# Altium integrated library TE PCB Connectors.IntLib: 30 symbols
Pins are listed as number, name and electrical type; pins without a type are passive.

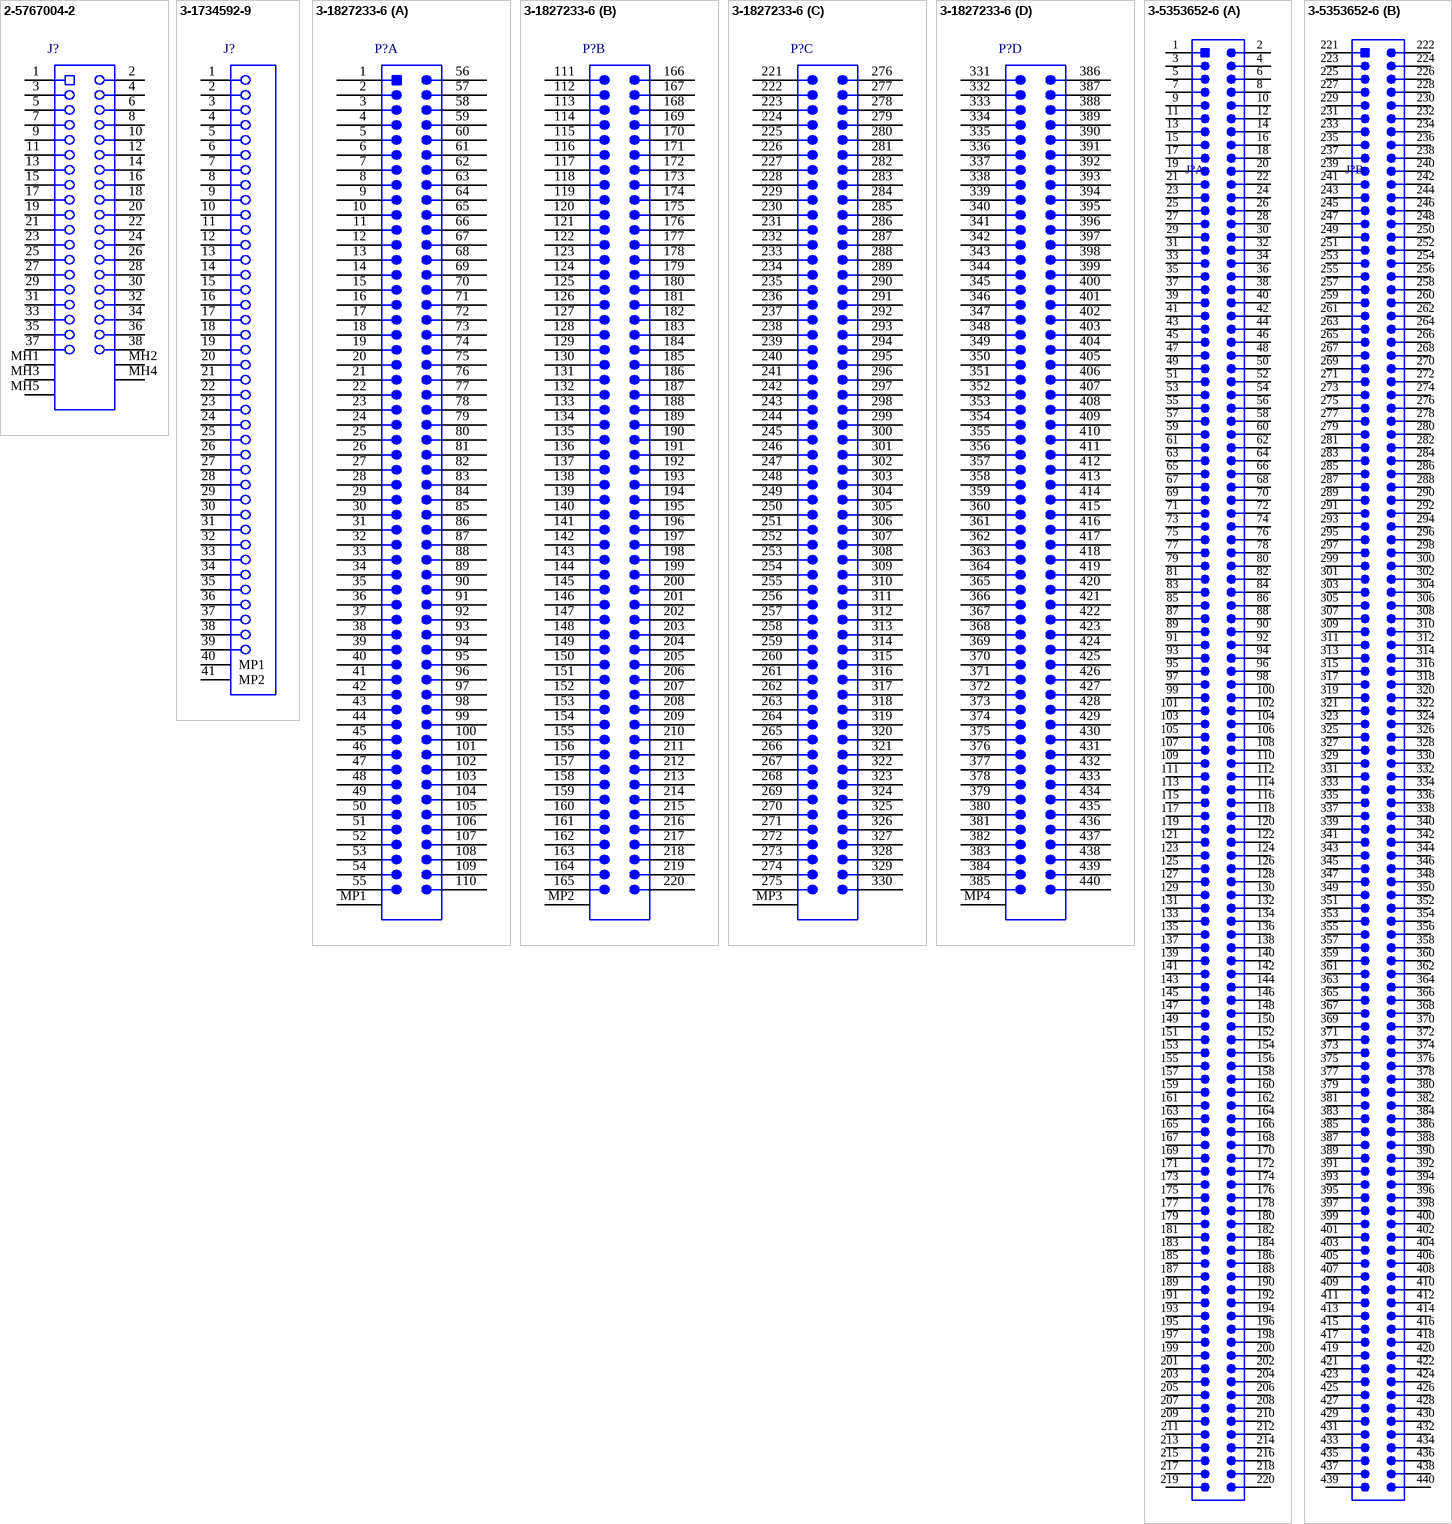
[diagram p0: symbols 2-5767004-2 to 3-5353652-6]

## 2-5767004-2
designator J?
Female Header, Pitch 0.64 mm, 2 x 19 Position, Height 6.35 mm, Tail Height 1.35 mm, RoHS, Tube; Pitch Spacing: 0.64mm; Row Pitch: 7.06mm; Gender: Receptacle; No. of Rows: 2; Product Range: MICTOR Series; No. of Contacts: 38; Contact Termination Type: Surface Mount; SVHC: To Be Advised; DatasheetVersion: Rev. D3; PackageReference: SMD; PackageDescription: Female Receptacle, Pitch 0.64 mm, 2 x 19 Position, Height 6.35 mm, Tail Height 1.35 mm; Supplier 1: Digi-Key; Supplier Part Number 1: A32308-ND; Contact Plating: Gold; Contact Material: Copper Alloy; Mounting Technology: Surface Mount; ComponentLink1Description: Manufacturer URL; ComponentLink1URL: http://www.te.com; ComponentLink2Description: Datasheet; ComponentLink2URL: http://www.te.com/commerce/DocumentDelivery/DDEController?Action=showdoc&DocId=Customer+Drawing%7F5767004%7FD3%7Fpdf%7FEnglish%7FENG_CD_5767004_D3.pdf%7F2-5767004-2
footprint TECO-2-5767004-2_V (Receptacle, 38-Leads, Body 25.4x6.91mm, Pitch 0.64mm)
pins: 1, 2, 3, 4, 5, 6, 7, 8, 9, 10, 11, 12, 13, 14, 15, 16, 17, 18, 19, 20, 21, 22, 23, 24, 25, 26, 27, 28, 29, 30, 31, 32, 33, 34, 35, 36, 37, 38, MH1, MH2, MH3, MH4, MH5

## 3-1734592-9
designator J?
FPC Connector, 0.5 A Max Current Rating, 250 V Operating Voltage, -20 to 85 degC, Pitch 0.5 mm, 1 x 39 Positions, RoHS, Tape and Reel; FFC, FCB Thickness: 0.30mm; Dynamic Catalog: 1734592, 1734742 and 1734839; Other Names: A101320DKR; Connector Type: Bottom Contacts; Current Rating: 0.500A; Number of Positions: 39; Pitch: 0.020" (0.50mm); Cable End Type: Straight; Locking Feature: Flip Lock; Voltage Rating: 250V; DatasheetVersion: Rev. C; PackageReference: SMD; Supplier 1: Digi-Key; Supplier Part Number 1: A101320TR-ND; Supplier 2: Digi-Key; Supplier Part Number 2: A101320CT-ND; Supplier 3: Digi-Key; Supplier Part Number 3: A101320DKR-ND; Operating Temperature: -40°C ~ 125°C; Features: Zero Insertion Force (ZIF); Contact Finish Thickness: Flash; Packaging: Digi-Reel®; Termination: Solder; Family: FFC, FPC (Flat Flexible) Connectors - Board Mount; Contact Finish: Gold; Housing Material: Liquid Crystal Polymer (LCP); RoHS Information: 3-1734592-9 Statement of Compliance; Mounting Type: Surface Mount, Right Angle; Height Above Board: 0.081" (2.05mm); Standard Package: 1; Category: Connectors, Interconnects; ComponentLink1Description: Manufacturer URL; ComponentLink1URL: http://www.te.com; ComponentLink2Description: Datasheet; ComponentLink2URL: http://www.te.com/catalog/pn/en/3-1734592-9?RQPN=3-1734592-9
footprint TECO-3-1734592-9-39_V (SMD, 39-Leads, Body 24.93x4.4mm, Pitch  0.5mm)
pins: 1, 2, 3, 4, 5, 6, 7, 8, 9, 10, 11, 12, 13, 14, 15, 16, 17, 18, 19, 20, 21, 22, 23, 24, 25, 26, 27, 28, 29, 30, 31, 32, 33, 34, 35, 36, 37, 38, 39, 40 MP1 "SCK for SPI serial clock SCL for I2C serial clock", 41 MP2 "SCK for SPI serial clock SCL for I2C serial clock"

## 3-1827233-6
designator P?
Connector Plug, Pitch 0.5 mm, 4 x 110 Position, Height 5.75 mm, -40 to 85 degC, RoHS, Tray; Pitch Spacing: 0.5mm; Row Pitch: 12mm; No. of Rows: 2; Product Range: FSI Series; No. of Contacts: 440; Contact Termination Type: Surface Mount; SVHC: To Be Advised; DatasheetVersion: Rev. B2; PackageReference: SMD; PackageDescription: Connector Plug, Pitch 0.5 mm, 4 x 110 Position, Height 5.75 mm; Supplier 1: Digi-Key; Supplier Part Number 1: 3-1827233-6-ND; Gender: Plug; Contact Plating: Gold; Contact Material: Copper Alloy; Mounting Technology: Surface Mount; ComponentLink1Description: Manufacturer URL; ComponentLink1URL: http://www.te.com; ComponentLink2Description: Datasheet; ComponentLink2URL: http://www.te.com/commerce/DocumentDelivery/DDEController?Action=showdoc&DocId=Customer+Drawing%7F1827233%7FB2%7Fpdf%7FEnglish%7FENG_CD_1827233_B2.pdf%7F3-1827233-6
footprint TECO-3-1827233-6_V (SMD, 440-Leads, Body 61.9x18.4mm, Pitch 0.5mm)
part A pins: 1, 2, 3, 4, 5, 6, 7, 8, 9, 10, 11, 12, 13, 14, 15, 16, 17, 18, 19, 20, 21, 22, 23, 24, 25, 26, 27, 28, 29, 30, 31, 32, 33, 34, 35, 36, 37, 38, 39, 40, 41, 42, 43, 44, 45, 46, 47, 48, 49, 50, 51, 52, 53, 54, 55, 56, 57, 58, 59, 60, 61, 62, 63, 64, 65, 66, 67, 68, 69, 70, 71, 72, 73, 74, 75, 76, 77, 78, 79, 80, 81, 82, 83, 84, 85, 86, 87, 88, 89, 90, 91, 92, 93, 94, 95, 96, 97, 98, 99, 100, 101, 102, 103, 104, 105, 106, 107, 108, 109, 110, MP1
part B pins: 111, 112, 113, 114, 115, 116, 117, 118, 119, 120, 121, 122, 123, 124, 125, 126, 127, 128, 129, 130, 131, 132, 133, 134, 135, 136, 137, 138, 139, 140, 141, 142, 143, 144, 145, 146, 147, 148, 149, 150, 151, 152, 153, 154, 155, 156, 157, 158, 159, 160, 161, 162, 163, 164, 165, 166, 167, 168, 169, 170, 171, 172, 173, 174, 175, 176, 177, 178, 179, 180, 181, 182, 183, 184, 185, 186, 187, 188, 189, 190, 191, 192, 193, 194, 195, 196, 197, 198, 199, 200, 201, 202, 203, 204, 205, 206, 207, 208, 209, 210, 211, 212, 213, 214, 215, 216, 217, 218, 219, 220, MP2
part C pins: 221, 222, 223, 224, 225, 226, 227, 228, 229, 230, 231, 232, 233, 234, 235, 236, 237, 238, 239, 240, 241, 242, 243, 244, 245, 246, 247, 248, 249, 250, 251, 252, 253, 254, 255, 256, 257, 258, 259, 260, 261, 262, 263, 264, 265, 266, 267, 268, 269, 270, 271, 272, 273, 274, 275, 276, 277, 278, 279, 280, 281, 282, 283, 284, 285, 286, 287, 288, 289, 290, 291, 292, 293, 294, 295, 296, 297, 298, 299, 300, 301, 302, 303, 304, 305, 306, 307, 308, 309, 310, 311, 312, 313, 314, 315, 316, 317, 318, 319, 320, 321, 322, 323, 324, 325, 326, 327, 328, 329, 330, MP3
part D pins: 331, 332, 333, 334, 335, 336, 337, 338, 339, 340, 341, 342, 343, 344, 345, 346, 347, 348, 349, 350, 351, 352, 353, 354, 355, 356, 357, 358, 359, 360, 361, 362, 363, 364, 365, 366, 367, 368, 369, 370, 371, 372, 373, 374, 375, 376, 377, 378, 379, 380, 381, 382, 383, 384, 385, 386, 387, 388, 389, 390, 391, 392, 393, 394, 395, 396, 397, 398, 399, 400, 401, 402, 403, 404, 405, 406, 407, 408, 409, 410, 411, 412, 413, 414, 415, 416, 417, 418, 419, 420, 421, 422, 423, 424, 425, 426, 427, 428, 429, 430, 431, 432, 433, 434, 435, 436, 437, 438, 439, 440, MP4

## 3-5353652-6
designator J?
Male Header, Pitch 0.5 mm, 2 x 220 Position, Height 7.462 mm, -40 to 85 degC, RoHS, Tray; Pitch Spacing: 0.5mm; Row Pitch: 12mm; Gender: Plug; No. of Rows: 2; Product Range: FSI Series; No. of Contacts: 440; Contact Termination Type: Surface Mount; SVHC: To Be Advised; PackageReference: SMD; PackageDescription: 440-Pin Surface Mount Device, Body 61.9 x 18.4 mm, Pitch 0.5 mm; Supplier 1: Digi-Key; Supplier Part Number 1: A115183-ND; Contact Plating: Gold; Contact Material: Copper Alloy; Mounting Technology: Surface Mount; ComponentLink1Description: Manufacturer URL; ComponentLink1URL: http://www.te.com; ComponentLink2Description: Datasheet; ComponentLink2URL: https://datasheet.ciiva.com/11747/0900766b80ddd721-11747899.pdf
footprint TECO-3-5353652-6-440_V (Receptacle, 440-Leads, Body 61.8x18.4mm, Pitch 0.5mm)
part A pins: 1, 2, 3, 4, 5, 6, 7, 8, 9, 10, 11, 12, 13, 14, 15, 16, 17, 18, 19, 20, 21, 22, 23, 24, 25, 26, 27, 28, 29, 30, 31, 32, 33, 34, 35, 36, 37, 38, 39, 40, 41, 42, 43, 44, 45, 46, 47, 48, 49, 50, 51, 52, 53, 54, 55, 56, 57, 58, 59, 60, 61, 62, 63, 64, 65, 66, 67, 68, 69, 70, 71, 72, 73, 74, 75, 76, 77, 78, 79, 80, 81, 82, 83, 84, 85, 86, 87, 88, 89, 90, 91, 92, 93, 94, 95, 96, 97, 98, 99, 100, 101, 102, 103, 104, 105, 106, 107, 108, 109, 110, 111, 112, 113, 114, 115, 116, 117, 118, 119, 120, 121, 122, 123, 124, 125, 126, 127, 128, 129, 130, 131, 132, 133, 134, 135, 136, 137, 138, 139, 140, 141, 142, 143, 144, 145, 146, 147, 148, 149, 150, 151, 152, 153, 154, 155, 156, 157, 158, 159, 160, 161, 162, 163, 164, 165, 166, 167, 168, 169, 170, 171, 172, 173, 174, 175, 176, 177, 178, 179, 180, 181, 182, 183, 184, 185, 186, 187, 188, 189, 190, 191, 192, 193, 194, 195, 196, 197, 198, 199, 200, 201, 202, 203, 204, 205, 206, 207, 208, 209, 210, 211, 212, 213, 214, 215, 216, 217, 218, 219, 220
part B pins: 221, 222, 223, 224, 225, 226, 227, 228, 229, 230, 231, 232, 233, 234, 235, 236, 237, 238, 239, 240, 241, 242, 243, 244, 245, 246, 247, 248, 249, 250, 251, 252, 253, 254, 255, 256, 257, 258, 259, 260, 261, 262, 263, 264, 265, 266, 267, 268, 269, 270, 271, 272, 273, 274, 275, 276, 277, 278, 279, 280, 281, 282, 283, 284, 285, 286, 287, 288, 289, 290, 291, 292, 293, 294, 295, 296, 297, 298, 299, 300, 301, 302, 303, 304, 305, 306, 307, 308, 309, 310, 311, 312, 313, 314, 315, 316, 317, 318, 319, 320, 321, 322, 323, 324, 325, 326, 327, 328, 329, 330, 331, 332, 333, 334, 335, 336, 337, 338, 339, 340, 341, 342, 343, 344, 345, 346, 347, 348, 349, 350, 351, 352, 353, 354, 355, 356, 357, 358, 359, 360, 361, 362, 363, 364, 365, 366, 367, 368, 369, 370, 371, 372, 373, 374, 375, 376, 377, 378, 379, 380, 381, 382, 383, 384, 385, 386, 387, 388, 389, 390, 391, 392, 393, 394, 395, 396, 397, 398, 399, 400, 401, 402, 403, 404, 405, 406, 407, 408, 409, 410, 411, 412, 413, 414, 415, 416, 417, 418, 419, 420, 421, 422, 423, 424, 425, 426, 427, 428, 429, 430, 431, 432, 433, 434, 435, 436, 437, 438, 439, 440

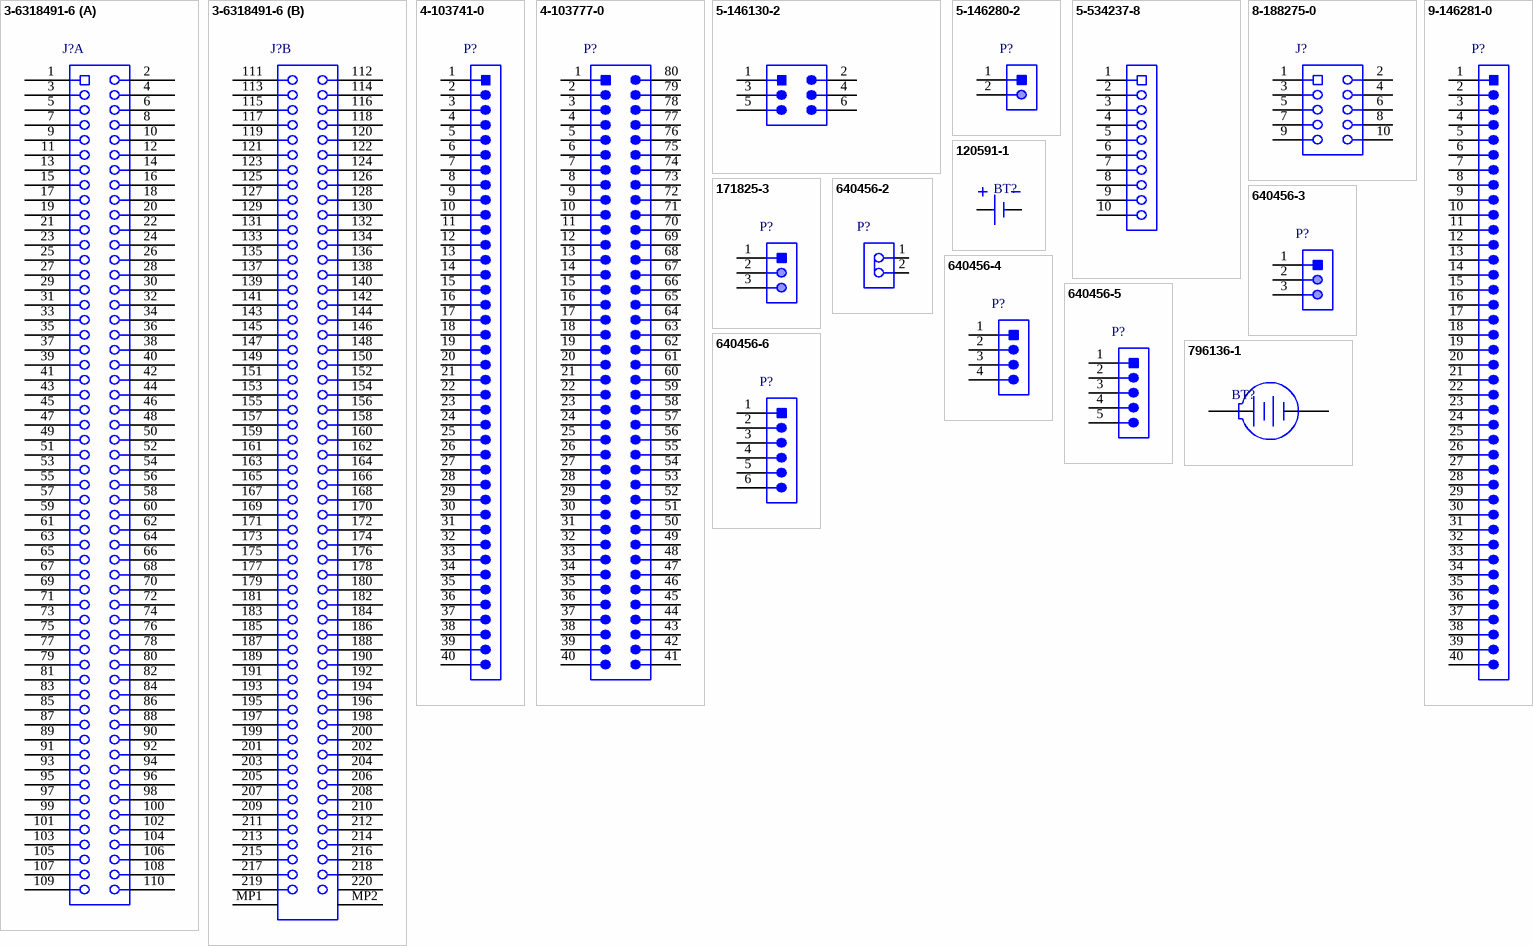
[diagram p1: symbols 3-6318491-6 to 796136-1]

## 3-6318491-6
designator J?
Female Header, Pitch 0.5 mm, 2 x 110 Position, Height 7.45 mm, -40 to 80 degC, RoHS, Tray; Pitch Spacing: 0.5mm; Gender: Plug; No. of Rows: 2Rows; Product Range: FSI Series; No. of Contacts: 220Contacts; Contact Termination Type: Surface Mount; SVHC: No SVHC (15-Jun-2015); DatasheetVersion: Rev. B; PackageReference: SMD; Supplier 1: Digi-Key; Supplier Part Number 1: A107335-ND; Row Pitch: -; Contact Plating: Gold Plated Contacts; Contact Material: Copper Alloy; Mounting Technology: Surface Mount; ComponentLink1Description: Manufacturer URL; ComponentLink1URL: http://www.te.com; ComponentLink2Description: Datasheet; ComponentLink2URL: https://datasheet.ciiva.com/1448/320635-1448651.pdf
footprint TECO-3-6318491-6-220_V (CONN, 220-Leads, Body 61.8x6.2mm, Pitch 0.5mm)
part A pins: 1, 2, 3, 4, 5, 6, 7, 8, 9, 10, 11, 12, 13, 14, 15, 16, 17, 18, 19, 20, 21, 22, 23, 24, 25, 26, 27, 28, 29, 30, 31, 32, 33, 34, 35, 36, 37, 38, 39, 40, 41, 42, 43, 44, 45, 46, 47, 48, 49, 50, 51, 52, 53, 54, 55, 56, 57, 58, 59, 60, 61, 62, 63, 64, 65, 66, 67, 68, 69, 70, 71, 72, 73, 74, 75, 76, 77, 78, 79, 80, 81, 82, 83, 84, 85, 86, 87, 88, 89, 90, 91, 92, 93, 94, 95, 96, 97, 98, 99, 100, 101, 102, 103, 104, 105, 106, 107, 108, 109, 110
part B pins: 111, 112, 113, 114, 115, 116, 117, 118, 119, 120, 121, 122, 123, 124, 125, 126, 127, 128, 129, 130, 131, 132, 133, 134, 135, 136, 137, 138, 139, 140, 141, 142, 143, 144, 145, 146, 147, 148, 149, 150, 151, 152, 153, 154, 155, 156, 157, 158, 159, 160, 161, 162, 163, 164, 165, 166, 167, 168, 169, 170, 171, 172, 173, 174, 175, 176, 177, 178, 179, 180, 181, 182, 183, 184, 185, 186, 187, 188, 189, 190, 191, 192, 193, 194, 195, 196, 197, 198, 199, 200, 201, 202, 203, 204, 205, 206, 207, 208, 209, 210, 211, 212, 213, 214, 215, 216, 217, 218, 219, 220, MP1, MP2

## 4-103741-0
designator P?
Male Header, Pitch 2.54 mm, 1 x 40 Position, Height 8.128 mm, Tail Length 2.286 mm, RoHS, Bulk; Catalog Drawings: 100 Center Single Straight Side; Dynamic Catalog: AMPMODU Mod II Series; Other Names: 4-103741-0-ND / A26509 / A26509-40 / A26509-ND; Connector Type: Header, Unshrouded, Breakaway; Number of Positions: 40; 3D Model: 4-103741-0.pdf; Featured Product: AMPMODU Connectors; Pitch: 0.100" (2.54mm); Number of Positions Loaded: All; PackageReference: THD; PackageDescription: Male Header, Pitch 2.54 mm, 1 x 40 Position, Height 8.128 mm, Tail Length 2.286 mm; Supplier 1: Digi-Key; Supplier Part Number 1: A26509-40-ND; Color: Black; Contact Finish Thickness: 100µin (2.54µm); Packaging: Bulk; Termination: Solder; Family: Rectangular Connectors - Headers, Male Pins; Contact Finish: Tin-Lead; Contact Type: Male Pin; Contact Mating Length: 0.230" (5.84mm); RoHS Information: 4-103741-0 Statement of Compliance; Mounting Type: Through Hole; Series: AMPMODU Mod II; Standard Package: 100; Number of Rows: 1; Category: Connectors, Interconnects; ComponentLink1Description: Manufacturer URL; ComponentLink1URL: http://www.te.com; ComponentLink2Description: Datasheet; ComponentLink2URL: http://sigma.octopart.com/12533693/technical_drawing/Agastat-4-103741-0.pdf
footprint TECO-4-103741-0_V (THD, 40-Leads, Body 101.194x2.337mm, Pitch 2.54mm)
pins: 1, 2, 3, 4, 5, 6, 7, 8, 9, 10, 11, 12, 13, 14, 15, 16, 17, 18, 19, 20, 21, 22, 23, 24, 25, 26, 27, 28, 29, 30, 31, 32, 33, 34, 35, 36, 37, 38, 39, 40

## 4-103777-0
designator P?
Male Header, Pitch 2.54 mm, 2 x 40 Position, Height 8.13 mm, Tail Length 2.29 mm,  -65 to 105 degC, RoHS, Bulk; Catalog Drawings: 100 Center Dual Straight Side; Dynamic Catalog: AMPMODU Mod II Series; Other Names: 4-103777-0-ND / A26525 / A26525-40 / A26525-ND; Mating Products: 4-534998-0-ND / - CONN RCPT 80POS DL VERT .100 / 1-535512-3-ND / - CONN RCPT 80POS .100 GOLD / 2-535598-3-ND / - CONN RCPT 80POS .100 DUAL T/H AU / 4-535542-0-ND / - CONN RECEPT 80POS .100 VERT DUAL; Connector Type: Header, Unshrouded, Breakaway; Number of Positions: 80; Row Spacing: 0.100" (2.54mm); 3D Model: 4-103777-0.pdf; Featured Product: AMPMODU Connectors; Number of Positions Loaded: All; DatasheetVersion: Rev. 6-04; PackageReference: THD; PackageDescription: Male Header, Pitch 2.54 mm, 2 x 40 Position, Height 8.13 mm, Tail Length 2.29 mm; Supplier 1: Digi-Key; Supplier Part Number 1: A26525-40-ND; Color: Black; Contact Finish Thickness: 100µin (2.54µm); Packaging: Bulk; Termination: Solder; Family: Rectangular Connectors - Headers, Male Pins; Contact Finish: Tin-Lead; Contact Type: Male Pin; Contact Mating Length: 0.230" (5.84mm); Pitch: 0.100" (2.54mm); RoHS Information: 4-103777-0 Statement of Compliance; Mounting Type: Through Hole; Series: AMPMODU Mod II; Standard Package: 50; Number of Rows: 2; Category: Connectors, Interconnects; ComponentLink1Description: Manufacturer URL; ComponentLink1URL: http://www.te.com; ComponentLink2Description: Datasheet; ComponentLink2URL: http://www.onlinecomponents.com/datasheet/41037770.aspx?p=10364676
footprint TECO-4-103777-0_V (THD, 80-Leads, Body 101.19x4.88mm, Pitch 2.54mm)
pins: 1, 2, 3, 4, 5, 6, 7, 8, 9, 10, 11, 12, 13, 14, 15, 16, 17, 18, 19, 20, 21, 22, 23, 24, 25, 26, 27, 28, 29, 30, 31, 32, 33, 34, 35, 36, 37, 38, 39, 40, 41, 42, 43, 44, 45, 46, 47, 48, 49, 50, 51, 52, 53, 54, 55, 56, 57, 58, 59, 60, 61, 62, 63, 64, 65, 66, 67, 68, 69, 70, 71, 72, 73, 74, 75, 76, 77, 78, 79, 80

## 5-146130-2
designator P?
Male Header, Pitch 2.54 mm, 2 x 3 Position, Height 8.13 mm, -65 to 125 degC, RoHS, Tube; Mating Post Length: 5.84 mm; Mounting Angle: Vertical; Current Rating: 3 A; Insulation Resistance: 5000 MOhms; Number of Positions: 6; Row Spacing: 2.54 mm; Latching Type: Unlatched; Brand: TE Connectivity / AMP; Voltage Rating: 750 V; PackageReference: SMD; PackageDescription: Male Header, Pitch 2.54 mm, 2 x 3 Position, Height 8.13 mm; Supplier 1: Newark; Supplier Part Number 1: 74K4649; Supplier 2: Newark; Supplier Part Number 2: 81Y9856; Supplier 3: Farnell; Supplier Part Number 3: 2311147; Supplier 4: Digi-Key; Supplier Part Number 4: 5-146130-2-ND; RoHS: Details; Mounting Style: PCB; Packaging: Tube; Housing Material: Thermoplastic; Product Category: Headers & Wire Housings; Number of Positions / Contacts: 6; Pitch: 2.54 mm; Contact Plating: Gold; Operating Temperature Range: - 65 C to + 125 C; Tradename: AMPMODU; Type: Breakaway; Contact Material: Phosphor Bronze; Factory Pack Quantity: 72; Series: AMPMODU MOD II; Termination Style: SMD; Flammability Rating: UL 94 V-0; Contact Gender: Pin (Male); Product Type: Headers; Number of Rows: 2; ComponentLink1Description: Manufacturer URL; ComponentLink1URL: http://www.te.com; ComponentLink2Description: Datasheet; ComponentLink2URL: http://www.te.com/commerce/DocumentDelivery/DDEController?Action=showdoc&DocId=Customer+Drawing%7F146130%7FM%7Fpdf%7FEnglish%7FENG_CD_146130_M.pdf%7F5-146130-2
footprint TECO-5-146130-2_V (Header, 6-Leads, Body 7.21x4.88mm, Pitch 2.54mm)
pins: 1, 2, 3, 4, 5, 6

## 5-146280-2
designator P?
Male Header, Pitch 2.54 mm, 1 x 2 Position, Height 8.21 mm, Tail Length 3.05 mm, -65 to 105 degC, RoHS, Bulk; Part # Aliases: 374-1728; Mating Post Length: 5.84 mm; Mounting Angle: Vertical; Row Spacing: 2.54 mm; Qualification: Commercial; Brand: TE Connectivity; DatasheetVersion: Rev. H1; PackageReference: THD; PackageDescription: Male Header, Pitch 2.54 mm, 1 x 2 Position, Height 8.21 mm, Tail Length 3.05 mm; Supplier 1: Digi-Key; Supplier Part Number 1: A121480-ND; Product: Headers; RoHS: True; Packaging: Bulk; Termination Post Length: 3.05 mm; Number of Positions: 2 Position; Housing Material: Liquid Crystal Polymer (LCP); Product Category: Headers & Wire Housings; Pitch: 2.54 mm; Contact Plating: Gold; Tradename: AMPMODU; Type: Breakaway; Contact Material: Phosphor Bronze; Factory Pack Quantity: 500; Series: AMPMODU MOD II; Termination Style: Through Hole; Flammability Rating: UL 94 V-0; Contact Gender: Pin (Male); Number of Rows: 1 Row; ComponentLink1Description: Manufacturer URL; ComponentLink1URL: http://www.te.com; ComponentLink2Description: Datasheet; ComponentLink2URL: http://www.te.com/commerce/DocumentDelivery/DDEController?Action=showdoc&DocId=Customer+Drawing%7F146280%7FH1%7Fpdf%7FEnglish%7FENG_CD_146280_H1.pdf%7F5-146280-2
footprint TECO-5-146280-2_V (Connector, 2-Leads, Body 4.67x2.34mm, Pitch 2.54mm)
pins: 1, 2

## 5-534237-8
designator J?
Female Receptacle, Pitch 2.54 mm, 1 x 10 Position, Height 8.64 mm, Tail Length 2.92 mm, -65 to 105 degC, RoHS, Tube; Catalog Drawings: MOD IV Vertical Mount; Dynamic Catalog: AMPMODU Mod IV Series; Other Names: A32910; Mating Products: 146132-8-ND / - CONN HEADER BRKAWAY 10POS TIN / 104426-8-ND / - CONN HEADR BRKWAY 10POS GOLD / 104348-8-ND / - CONN HEADER 10POS R/A GOLD / 104347-8-ND / - CONN HEADER 10POS R/A GOLD / 104346-8-ND / - CONN HEADER 10POS VERT TIN / 1-146282-0-ND / - CONN HEADR BRKWAY .100 10POS STR / A34265-10-ND / - CONN HEADR BRKWAY .100 10POS R/A / A34264-10-ND / - CONN HEADR BRKWAY .100 10POS R/A / A34262-10-ND / - CONN HEADR BRKWAY .100 10POS R/A / A34261-10-ND / - CONN HEADR BRKWAY .100 10POS R/A / More...; Number of Positions: 10; Featured Product: AMPMODU Connectors; Pitch: 0.100" (2.54mm); Number of Positions Loaded: All; PackageReference: THD; PackageDescription: Female Receptacle, Pitch 2.54 mm, 1 x 10 Position, Height 8.64 mm, Tail Length 2.92 mm; Supplier 1: Digi-Key; Supplier Part Number 1: A32910-ND; Color: Black; Connector Type: Receptacle; Contact Finish Thickness: 30µin (0.76µm); Packaging: Tube; Termination: Solder; Family: Rectangular Connectors - Headers, Receptacles, Female Sockets; Contact Finish: Gold; Contact Type: Female Socket; RoHS Information: 5-534237-8 Statement of Compliance; Mounting Type: Through Hole; Series: AMPMODU Mod IV; Standard Package: 22; Number of Rows: 1; Category: Connectors, Interconnects; ComponentLink1Description: Manufacturer URL; ComponentLink1URL: http://www.te.com; ComponentLink2Description: Datasheet; ComponentLink2URL: http://www.te.com/commerce/DocumentDelivery/DDEController?Action=showdoc&DocId=Customer+Drawing%7F534237%7FR5%7Fpdf%7FEnglish%7FENG_CD_534237_R5.pdf%7F5-534237-8
footprint TECO-5-534237-8_V (Receptacle, 10-Leads, Body 25.4x3.56mm, Pitch 2.54mm)
pins: 1, 2, 3, 4, 5, 6, 7, 8, 9, 10

## 8-188275-0
designator J?
Female Header, Pitch 2.54 mm, 2 x 5 Position, Height 5.3 mm, -40 to 105 degC, RoHS, Tape and Reel; Dynamic Catalog: Micro-MaTch Series; Other Names: A99476DKR; Mating Products: 1-338728-0-ND / - CONN HEADER 10POS DL VERT SMD; Connector Type: Receptacle; Number of Positions: 10; 3D Model: 8-188275-0.pdf; Featured Product: Micro-MaTch Connector Series; Pitch: 0.100" (2.54mm); Number of Positions Loaded: All; DatasheetVersion: Rev. S3; PackageReference: SMD; PackageDescription: Female Header, Pitch 2.54 mm, 2 x 5 Position, Height 5.3 mm; Supplier 1: Digi-Key; Supplier Part Number 1: A99476TR-ND; Supplier 2: Digi-Key; Supplier Part Number 2: A99476CT-ND; Supplier 3: Digi-Key; Supplier Part Number 3: A99476DKR-ND; Color: Red; Packaging: Digi-Reel®; Termination: Solder; Family: Rectangular Connectors - Headers, Receptacles, Female Sockets; Contact Finish: Tin; Contact Type: Female Socket; RoHS Information: 8-188275-0 Statement of Compliance; Mounting Type: Surface Mount; Series: Micro-MaTch; Standard Package: 1; Number of Rows: 2; Category: Connectors, Interconnects; ComponentLink1Description: Manufacturer URL; ComponentLink1URL: http://www.te.com; ComponentLink2Description: Datasheet; ComponentLink2URL: https://datasheet.ciiva.com/11745/0900766b8002f35f-11745198.pdf
footprint TECO-8-188275-0_V (SMD, 10-Leads, Body 14.7x6.9mm, Pitch 2.54mm)
pins: 1, 2, 3, 4, 5, 6, 7, 8, 9, 10

## 9-146281-0
designator P?
Male Header, Pitch 2.54 mm, 1 x 40 Position, Height 8.21 mm, Tail Length 3.05 mm, -65 to 105 degC, RoHS, Bulk; Catalog Drawings: 100 Center Single Straight Side; Dynamic Catalog: AMPMODU Mod II Series; Other Names: A34254-40; Connector Type: Header, Unshrouded, Breakaway; Number of Positions: 40; 3D Model: 9-146281-0.pdf; Featured Product: AMPMODU Connectors; Pitch: 0.100" (2.54mm); Number of Positions Loaded: All; DatasheetVersion: Rev. G; PackageReference: THD; PackageDescription: Male Header, Pitch 2.54 mm, 1 x 40 Position, Height 8.21 mm, Tail Length 3.05 mm; Supplier 1: Digi-Key; Supplier Part Number 1: A34254-40-ND; Color: Black; Contact Finish Thickness: 30µin (0.76µm); Packaging: Tray; Termination: Solder; Family: Rectangular Connectors - Headers, Male Pins; Contact Finish: Gold; Contact Type: Male Pin; Contact Mating Length: 0.230" (5.84mm); RoHS Information: 9-146281-0 Statement of Compliance; Mounting Type: Through Hole; Series: AMPMODU Mod II; Standard Package: 100; Number of Rows: 1; Category: Connectors, Interconnects; ComponentLink1Description: Manufacturer URL; ComponentLink1URL: http://www.te.com; ComponentLink2Description: Datasheet; ComponentLink2URL: http://www.te.com/commerce/DocumentDelivery/DDEController?Action=showdoc&DocId=Customer+Drawing%7F146281%7FG%7Fpdf%7FEnglish%7FENG_CD_146281_G_146281_1_c.dwg.pdf%7F9-146281-0
footprint TECO-9-146281-0_V (Header, 40-Leads, Body 101.2x2.34mm, Pitch 2.54mm)
pins: 1, 2, 3, 4, 5, 6, 7, 8, 9, 10, 11, 12, 13, 14, 15, 16, 17, 18, 19, 20, 21, 22, 23, 24, 25, 26, 27, 28, 29, 30, 31, 32, 33, 34, 35, 36, 37, 38, 39, 40

## 120591-1
designator BT?
Lithium Battery Holder for CR2032 3V Cell; Other Names: 120591-1-ND / A99328; Battery Type, Function: Coin Cell, Holder; Style: Holder (Open); For Use With: SY189-ND / - BATT LITH COIN 3V 20MM / SY188-ND / - BATT LITH COIN 3V 20MM / SY138-ND / - BATT LITH COIN 3V 20MM / N189-ND / - BATTERY LITHIUM COIN 3 VOLT 20MM / N188-ND / - BATTERY LITHIUM COIN 3 VOLT 20MM / N138-ND / - BATTERY LITHIUM COIN 3 VOLT 20MM / N037-ND / - BATTERY LITHIUM COIN 3 VOLT 20MM / P037-ND / - BATTERY LITHIUM COIN 3V 20MM / P189-ND / - BATTERY LITHIUM COIN 3V 20MM / P188-ND / - BATTERY LITHIUM COIN 3V 20MM / More...; 3D Model: 120591-1.pdf; Dynamic Catalog: A9932 Series; Battery Series: 2032; Number of Cells: 1; Battery Cell Size: Coin, 20.0mm; DatasheetVersion: Rev. H; PackageReference: THD; Supplier 1: Digi-Key; Supplier Part Number 1: A99328-ND; Standard Package: 2,736; Height Above Board: 0.249" (6.32mm); RoHS Information: 120591-1 Statement of Compliance; Family: Battery Holders, Clips, Contacts; Termination Style: PC Pin; Category: Battery Products; Mounting Type: PCB, Through Hole; Mounting Technology: Through Hole; ComponentLink1Description: Manufacturer URL; ComponentLink1URL: http://www.te.com; ComponentLink2Description: Datasheet; ComponentLink2URL: http://www.te.com/commerce/DocumentDelivery/DDEController?Action=showdoc&DocId=Customer+Drawing%7F120591%7FH%7Fpdf%7FEnglish%7FENG_CD_120591_H.pdf%7F120591-1
footprint TECO-120591-1-2_V (Lithium Battery Holder)
pins: 1 +, 2 -
